# Altium footprint library FxPcbLib.PcbLib: 112 footprints (part 1 of 7)
Each footprint in its own frame and in the unit in brackets; x right, y up, seen from the top. Pads: shape width x height; smd on the part's side, far side on the other; paste and mask are expansions set on the pad; w line width, h text height; cw(c..) or ccw(c..) is an arc to the next point about the centre after c.
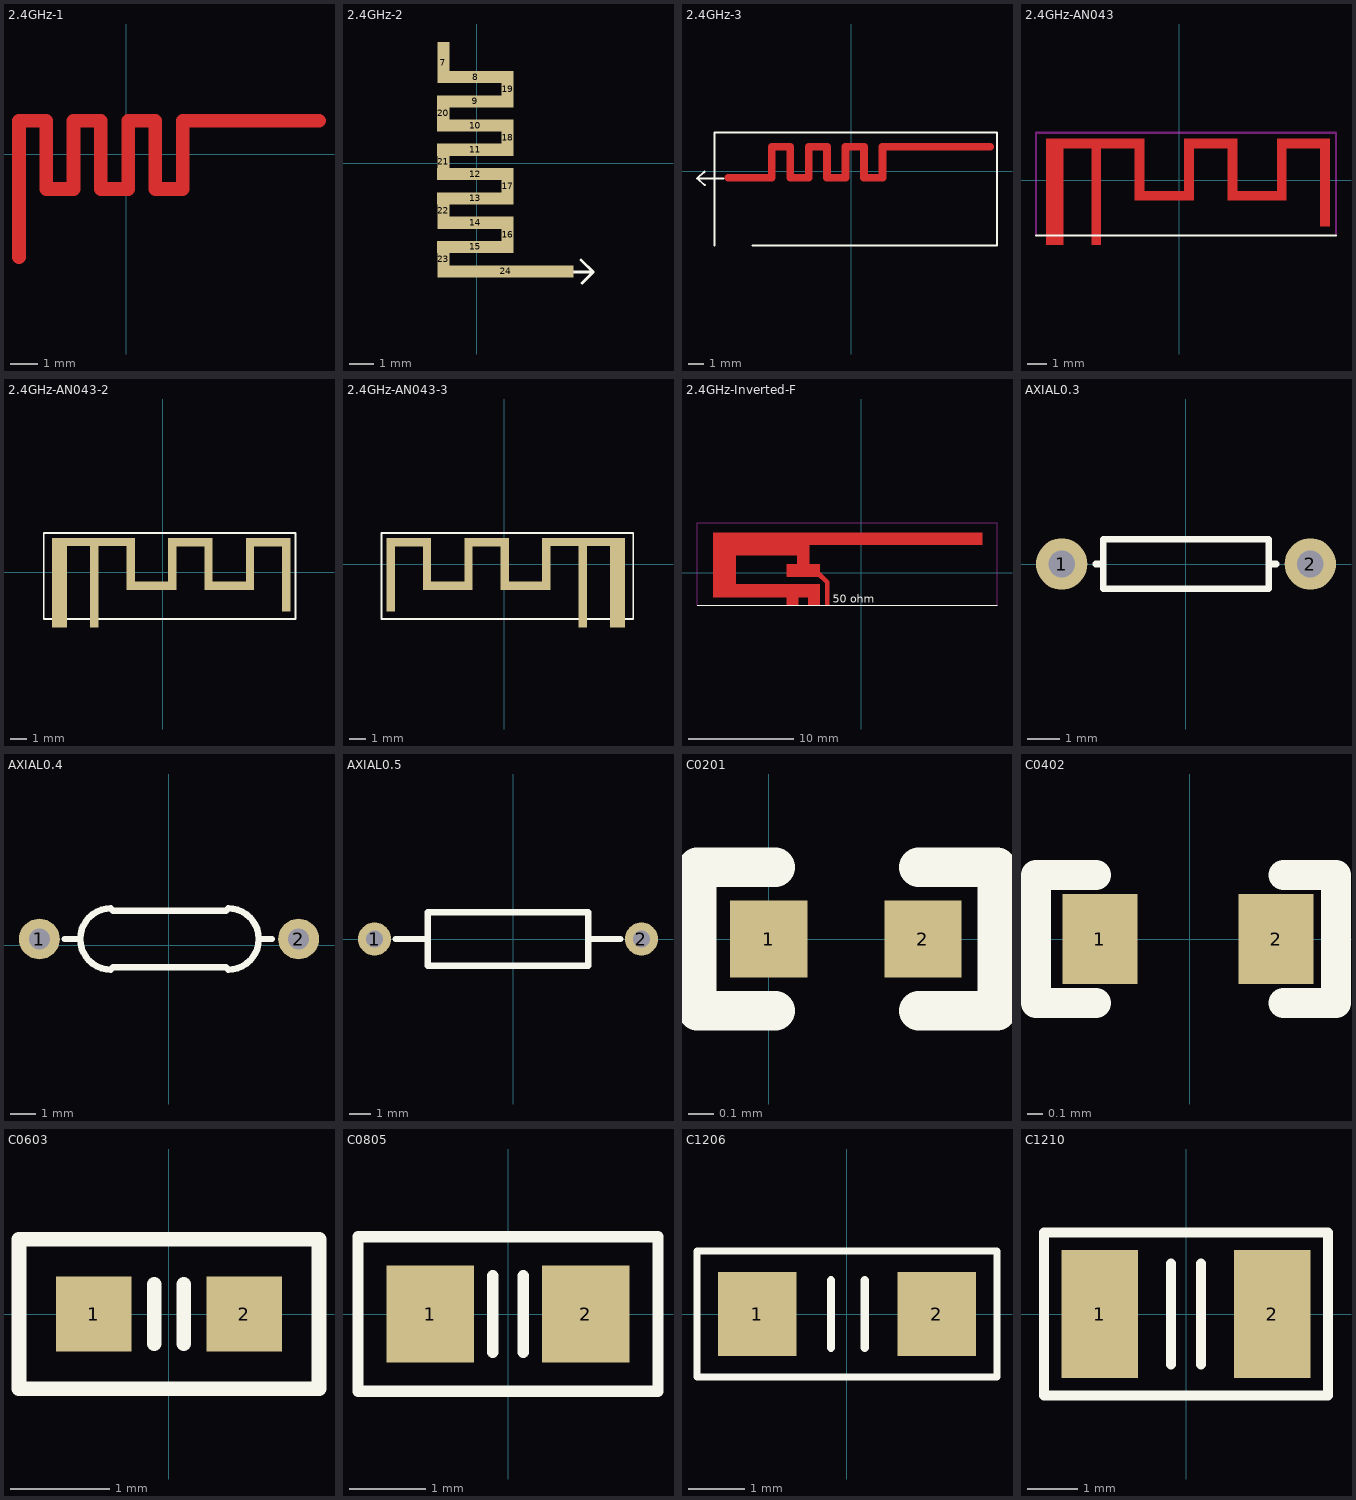
[diagram p0: the footprints below, top view; thin cyan lines are the x and y axes]

## 2.4GHz-1 [mm]
Top Layer:
  lines w0.5: -3.941,-3.769 -3.941,1.231 -2.941,1.231 -2.941,-1.269 -1.941,-1.269 -1.941,1.191 ; -1.941,1.231 -0.941,1.231 -0.941,-1.269 0.059,-1.269 0.059,1.221 ; 0.059,1.231 1.059,1.231 1.059,-1.269 2.059,-1.269 2.059,1.231 7.059,1.231

## 2.4GHz-2 [mm]
pads (18):
  rect 0.5x1.702 smd: 7(-1.383,4.161)
  rect 3.15x0.5 smd: 8(-0.057,3.56) 9(-0.064,2.559) 10(-0.064,1.56) 11(-0.064,0.562) 12(-0.064,-0.445) 13(-0.064,-1.445) 14(-0.062,-2.448) 15(-0.064,-3.45)
  rect 0.5x1.5 smd: 16(1.261,-2.951) 17(1.261,-0.945) 18(1.261,1.062) 19(1.266,3.059) 20(-1.389,2.06) 21(-1.389,0.06) 22(-1.387,-1.945) 23(-1.389,-3.958)
  rect 5.58x0.5 smd: 24(1.198,-4.458)
Top Overlay:
  lines w0.127: 3.646,-4.486 4.796,-4.486 ; 4.296,-3.986 4.796,-4.486 ; 4.346,-4.936 4.796,-4.486

## 2.4GHz-3 [mm]
Top Layer:
  lines w0.5: -7.964,-0.43 -5.164,-0.43 -5.164,1.57 -3.964,1.57 -3.964,-0.43 -2.764,-0.43 -2.764,1.57 -1.564,1.57 -1.564,-0.43 -0.364,-0.43 -0.364,1.57 0.836,1.57 0.836,-0.43 2.036,-0.43 2.036,1.57 9.036,1.57
Top Overlay:
  lines w0.127: -9.515,-0.03 -10.015,-0.48 ; -9.505,-0.92 -10.015,-0.48 ; -8.876,-4.846 -8.876,2.51 9.476,2.51 9.476,-4.846 -6.412,-4.846 ; -8.294,-0.48 -10.015,-0.48

## 2.4GHz-AN043 [mm]
Top Layer:
  rectangle: 7.144,-2.342 7.644,1.598
  rectangle: 4.944,1.598 7.644,2.098
  rectangle: 4.944,-1.042 5.444,1.598
  rectangle: 2.944,-1.042 4.944,-0.542
  rectangle: 2.444,-1.042 2.944,1.598
  rectangle: 0.244,1.598 2.944,2.098
  rectangle: 0.244,-1.042 0.744,1.598
  rectangle: -1.756,-1.042 0.244,-0.542
  rectangle: -2.256,-1.042 -1.756,1.598
  rectangle: -6.756,1.598 -1.756,2.098
  rectangle: -6.756,-3.302 -5.856,1.598
  rectangle: -4.456,-3.302 -3.956,1.598
Top Overlay:
  lines w0.102: -7.256,-2.802 7.944,-2.802
Keep-Out Layer:
  lines w0.102: -7.256,-2.802 -7.256,2.398 7.944,2.398 7.944,-2.802

## 2.4GHz-AN043-2 [mm]
pads (12):
  rect 0.9x4.9 smd: ""(-6.223,-0.889)
  rect 5x0.5 smd: ""(-4.173,1.811)
  rect 0.5x4.9 smd: ""(-4.123,-0.889)
  rect 0.5x2.64 smd: ""(-1.923,0.241) ""(0.577,0.241) ""(2.777,0.241) ""(5.277,0.241)
  rect 2x0.5 smd: ""(-0.673,-0.829) ""(4.027,-0.829)
  rect 2.7x0.5 smd: ""(1.677,1.803) ""(6.377,1.803)
  rect 0.5x3.94 smd: ""(7.477,-0.409)
Top Overlay:
  lines w0.102: -7.173,-2.839 -7.173,2.361 8.027,2.361 8.027,-2.839 -7.173,-2.839

## 2.4GHz-AN043-3 [mm]
pads (13):
  rect 0.3x0.3 smd paste+0 mask+0.15: 1(4.75,-3.581)
  rect 0.5x3.94 smd: ""(-6.85,-0.87)
  rect 2.7x0.5 smd: ""(-5.75,1.342) ""(-1.05,1.342)
  rect 0.5x2.64 smd: ""(-4.65,-0.22) ""(-2.15,-0.22) ""(0.05,-0.22) ""(2.55,-0.22)
  rect 2x0.5 smd: ""(-3.4,-1.29) ""(1.3,-1.29)
  rect 0.5x4.9 smd: ""(4.75,-1.35)
  rect 5x0.5 smd: ""(4.8,1.35)
  rect 0.9x4.9 smd: ""(6.85,-1.35)
Top Overlay:
  lines w0.102: -7.4,-3.3 -7.4,1.9 7.8,1.9 7.8,-3.3 -7.4,-3.3

## 2.4GHz-Inverted-F [mm]
Top Layer:
  rectangle: -14.072,-2.362 -3.892,-1.072
  rectangle: -14.072,-1.072 -11.892,1.598
  rectangle: -14.072,1.598 -6.092,3.808
  rectangle: -6.092,2.598 11.508,3.808
  rectangle: -6.092,0.798 -4.892,2.598
  rectangle: -7.092,-0.402 -3.892,0.808
  rectangle: -5.055,-3.102 -3.892,-2.362
  rectangle: -7.092,-3.102 -5.918,-2.362
  rectangle: -3.442,-3.102 -2.982,-0.838
  region: -3.307,-1.163 -2.982,-0.838 -4.036,0.216 -4.361,-0.109
Top Overlay:
  lines w0.102: -15.57,-3.124 12.903,-3.124
  text "50 ohm" at -2.692,-2.87 h0.76
Keep-Out Layer:
  lines w0.102: -15.57,-3.124 -15.57,4.75 12.903,4.75 12.903,-3.124

## AXIAL0.3 [mil]
pads (2):
  round 62 hole 32: 1(-150,0) 2(150,0)
Top Overlay:
  lines w8: -109,0 -100,0 ; 109,0 100,0 ; 100,0 100,-30 -100,-30 -100,30 100,30 100,0
3D body: height 86.32, standoff -31.5, extent -155,-45 155,40.63

## AXIAL0.4 [mm]
pads (2):
  round 1.6 hole 0.813: 1(-5.08,0.254) 2(5.08,0.254)
Top Overlay:
  lines w0.254: -4.08,0.254 -3.48,0.254 ; 3.52,0.254 4.02,0.254 ; -2.28,-0.946 cw(c-2.28,0.254) -2.28,1.454 -2.18,1.354 2.22,1.354 2.32,1.454 cw(c2.32,0.254) 2.32,-0.946 2.22,-0.846 -2.18,-0.846 -2.28,-0.946
3D body: height 2.96, standoff -2.3, extent -5.334,-1.016 5.426,1.504

## AXIAL0.5 [mil]
pads (2):
  round 62 hole 32: 1(-260,0) 2(240,0)
Top Overlay:
  lines w12: -220,0 -160,0 ; 140,0 200,0 ; -160,-50 -160,50 140,50 140,-50 -160,-50
3D body: height 119.08, standoff -59.06, extent -265,-55 245,51.27

## C0201 [mm]
pads (2):
  rect 0.3x0.3 smd: 1(0,0) 2(0.6,0)
Top Overlay:
  lines w0.152: 0.025,-0.279 -0.279,-0.279 -0.279,0.279 0.025,0.279 ; 0.584,-0.279 0.889,-0.279 0.889,0.279 0.584,0.279
3D body: height 0.31, standoff 0, extent 0,-0.152 0.61,0.153

## C0402 [mm]
pads (2):
  rect 0.5x0.6 smd: 1(-0.6,0) 2(0.575,0)
Top Overlay:
  lines w0.2: -0.625,-0.425 -1.025,-0.425 -1.025,0.425 -0.625,0.425 ; 0.625,-0.425 0.975,-0.425 0.975,0.425 0.625,0.425
3D body: height 0.49, standoff 0, extent -0.525,-0.25 0.475,0.25

## C0603 [mil]
pads (2):
  rect 30x30 smd: 1(-30,0) 2(30,0)
Top Overlay:
  lines w5.91: -5.91,-11.81 -5.91,11.81 ; 5.91,-11.81 5.91,11.81 ; -59.76,-29.76 59.76,-29.76 59.76,29.76 -59.76,29.76 -59.76,-29.76
3D body: height 34.65, standoff 0, extent -30,-15 32.99,16.89

## C0805 [mil]
pads (2):
  rect 45x50 smd: 1(-40,0) 2(40,0)
Top Overlay:
  lines w5.91: -7.87,-19.68 -7.87,19.69 ; 7.87,-19.68 7.87,19.69 ; -77.26,-39.76 77.26,-39.76 77.26,39.76 -77.26,39.76 -77.26,-39.76
3D body: height 36.22, standoff 0, extent -41.54,-23.27 37.6,25.95

## C1206 [mm]
pads (2):
  rect 1.4x1.5 smd: 1(-1.6,0) 2(1.6,0)
Top Overlay:
  lines w0.127: -2.675,-1.125 2.675,-1.125 2.675,1.125 -2.675,1.125 -2.675,-1.125
  lines w0.15: -0.285,-0.6 -0.285,0.6 ; 0.315,-0.6 0.315,0.6
3D body: height 0, standoff -0.94, extent -1.651,-0.762 1.549,0.838

## C1210 [mil]
pads (2):
  rect 60x100 smd: 1(-67.5,0) 2(67.5,0)
Top Overlay:
  lines w7.87: -11.81,-39.37 -11.81,39.37 ; 11.81,-39.37 11.81,39.37 ; -111.28,-63.78 111.28,-63.78 111.28,63.78 -111.28,63.78 -111.28,-63.78
3D body: height 37.01, standoff 0, extent -65,-50 60.98,48.43